# Altium footprint library Connectors THD.PcbLib: 631 footprints (part 35 of 46)
Each footprint in its own frame and in the unit in brackets; x right, y up, seen from the top. Pads: shape width x height; smd on the part's side, far side on the other; paste and mask are expansions set on the pad; w line width, h text height; cw(c..) or ccw(c..) is an arc to the next point about the centre after c.
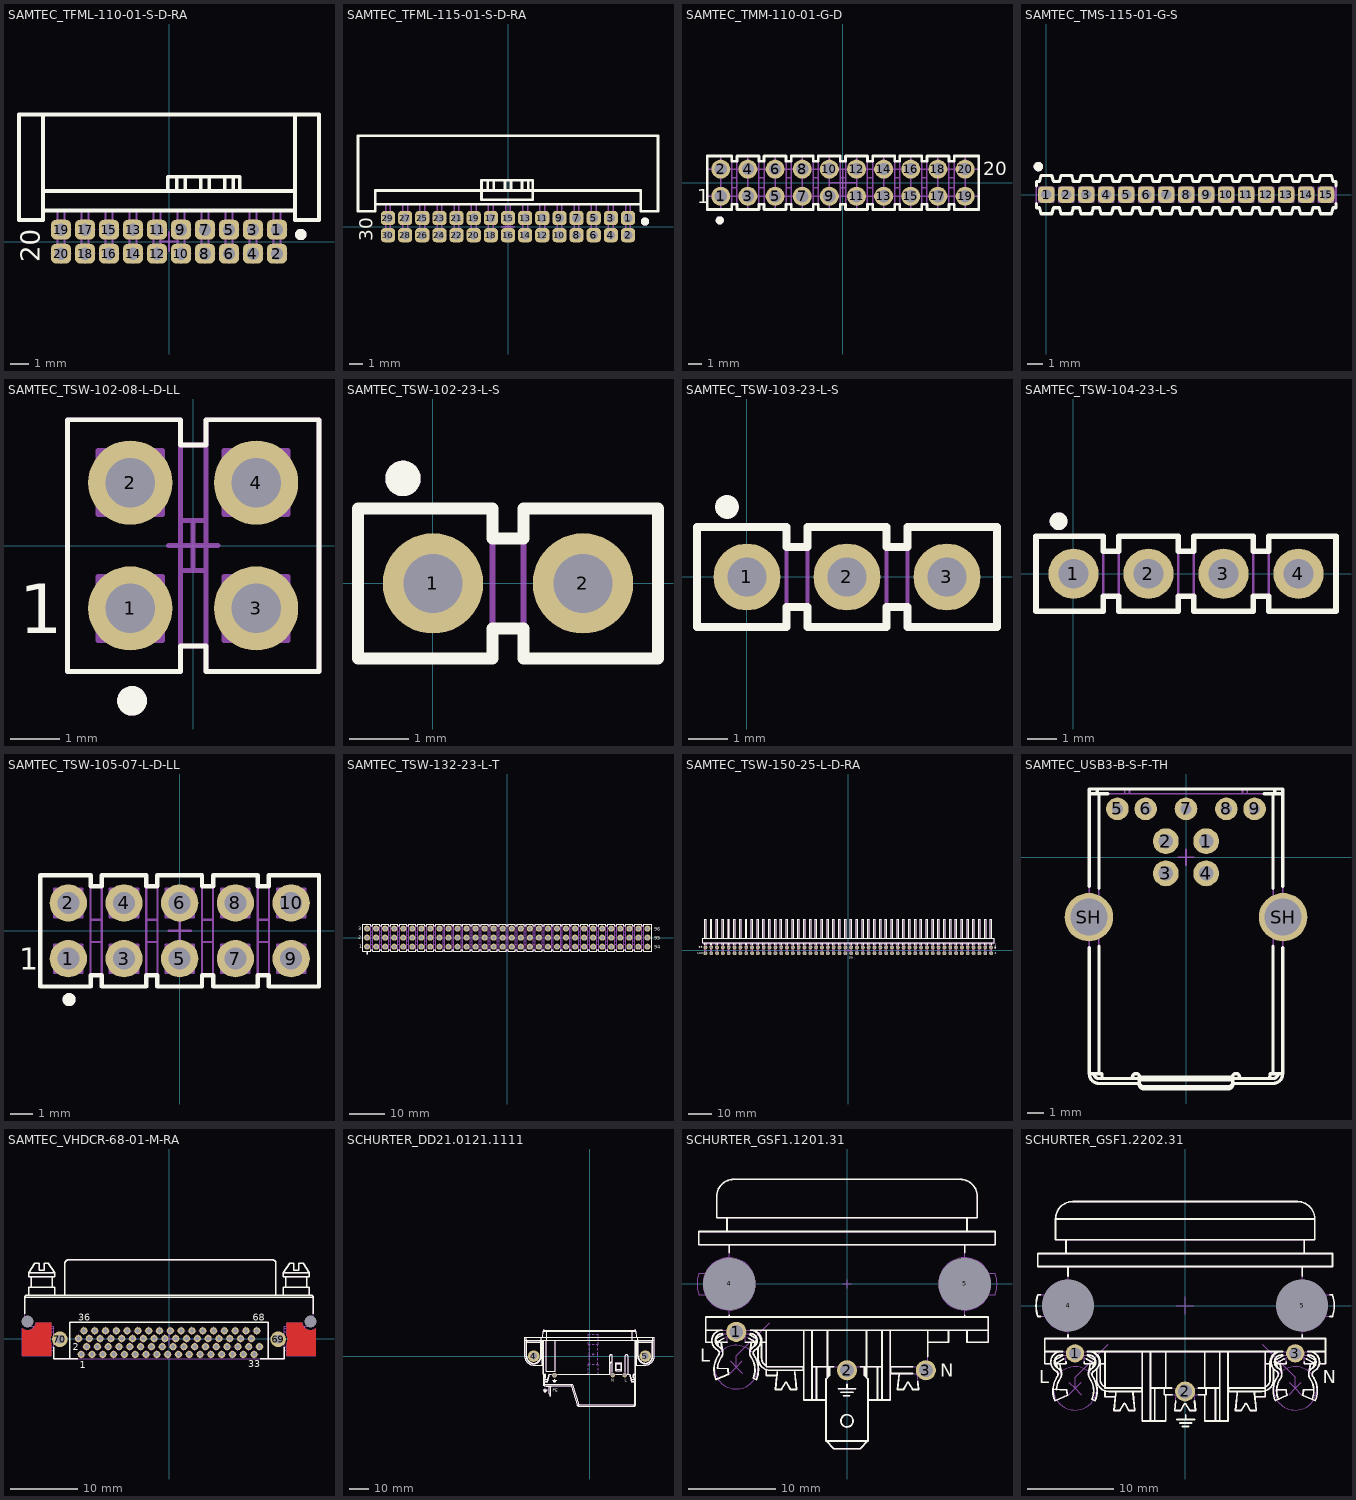
[diagram p34: the footprints below, top view; thin cyan lines are the x and y axes]

## SAMTEC_TFML-110-01-S-D-RA [mm] "20 Contacts - Pitch 1.27mm - Dual Row Right Angle Through-Hole Header"
height 5.72
pads (20):
  rrect50% 1.05x1.05 hole 0.65: 1(5.715,0.635) 2(5.715,-0.635) 3(4.445,0.635) 4(4.445,-0.635) 5(3.175,0.635) 6(3.175,-0.635) 7(1.905,0.635) 8(1.905,-0.635) 9(0.635,0.635) 10(0.635,-0.635) 11(-0.635,0.635) 12(-0.635,-0.635) 13(-1.905,0.635) 14(-1.905,-0.635) 15(-3.175,0.635) 16(-3.175,-0.635) 17(-4.445,0.635) 18(-4.445,-0.635) 19(-5.715,0.635) 20(-5.715,-0.635)
Top Overlay:
  circle w0.3: c6.975,0.375 r0.15
  lines w0.2: -6.668,1.651 6.668,1.651 ; -6.668,2.678 6.668,2.678 ; -6.668,6.731 -6.668,1.143 -7.938,1.143 -7.938,6.731 7.938,6.731 7.938,1.143 6.668,1.143 6.668,6.731 ; -0.064,2.678 -0.064,3.429 3.747,3.429 3.747,2.678 ; 0.406,2.678 0.406,3.429 ; 0.864,2.678 0.864,3.429 ; 1.676,2.678 1.676,3.429 ; 2.134,2.678 2.134,3.429 ; 2.946,2.678 2.946,3.429 ; 3.404,2.678 3.404,3.429
  text "20" at -6.847,-1.097 h1
Mechanical 8:
  lines w0.1: -6.215,-0.635 -5.715,-0.635 ; -6.215,0.635 -5.715,0.635 ; -5.715,-1.135 -5.715,-0.635 ; -5.715,-0.135 -5.715,-0.635 ; -5.715,0.135 -5.715,0.635 ; -5.715,1.135 -5.715,0.635 ; -5.215,-0.635 -5.715,-0.635 ; -5.215,0.635 -5.715,0.635 ; -4.945,-0.635 -4.445,-0.635 ; -4.945,0.635 -4.445,0.635 ; -4.445,-1.135 -4.445,-0.635 ; -4.445,-0.135 -4.445,-0.635 ; -4.445,0.135 -4.445,0.635 ; -4.445,1.135 -4.445,0.635 ; -3.945,-0.635 -4.445,-0.635 ; -3.945,0.635 -4.445,0.635 ; -3.675,-0.635 -3.175,-0.635 ; -3.675,0.635 -3.175,0.635 ; -3.175,-1.135 -3.175,-0.635 ; -3.175,-0.135 -3.175,-0.635 ; -3.175,0.135 -3.175,0.635 ; -3.175,1.135 -3.175,0.635 ; -2.675,-0.635 -3.175,-0.635 ; -2.675,0.635 -3.175,0.635 ; -2.405,-0.635 -1.905,-0.635 ; -2.405,0.635 -1.905,0.635 ; -1.905,-1.135 -1.905,-0.635 ; -1.905,-0.135 -1.905,-0.635 ; -1.905,0.135 -1.905,0.635 ; -1.905,1.135 -1.905,0.635 ; -1.405,-0.635 -1.905,-0.635 ; -1.405,0.635 -1.905,0.635 ; -1.135,-0.635 -0.635,-0.635 ; -1.135,0.635 -0.635,0.635 ; -0.635,-1.135 -0.635,-0.635 ; -0.635,-0.135 -0.635,-0.635 ; -0.635,0.135 -0.635,0.635 ; -0.635,1.135 -0.635,0.635 ; -0.5,0 0,0 ; -0.135,-0.635 -0.635,-0.635 ; -0.135,0.635 -0.635,0.635 ; 0,-0.5 0,0 ; 0,0.5 0,0 ; 0.135,-0.635 0.635,-0.635 ; 0.135,0.635 0.635,0.635 ; 0.5,0 0,0 ; 0.635,-1.135 0.635,-0.635 ; 0.635,-0.135 0.635,-0.635 ; 0.635,0.135 0.635,0.635 ; 0.635,1.135 0.635,0.635 ; 1.135,-0.635 0.635,-0.635 ; 1.135,0.635 0.635,0.635 ; 1.405,-0.635 1.905,-0.635 ; 1.405,0.635 1.905,0.635 ; 1.905,-1.135 1.905,-0.635 ; 1.905,-0.135 1.905,-0.635 ; 1.905,0.135 1.905,0.635 ; 1.905,1.135 1.905,0.635 ; 2.405,-0.635 1.905,-0.635 ; 2.405,0.635 1.905,0.635 ; 2.675,-0.635 3.175,-0.635 ; 2.675,0.635 3.175,0.635 ; 3.175,-1.135 3.175,-0.635 ; 3.175,-0.135 3.175,-0.635 ; 3.175,0.135 3.175,0.635 ; 3.175,1.135 3.175,0.635 ; 3.675,-0.635 3.175,-0.635 ; 3.675,0.635 3.175,0.635 ; 3.945,-0.635 4.445,-0.635 ; 3.945,0.635 4.445,0.635 ; 4.445,-1.135 4.445,-0.635 ; 4.445,-0.135 4.445,-0.635 ; 4.445,0.135 4.445,0.635 ; 4.445,1.135 4.445,0.635 ; 4.945,-0.635 4.445,-0.635 ; 4.945,0.635 4.445,0.635 ; 5.215,-0.635 5.715,-0.635 ; 5.215,0.635 5.715,0.635 ; 5.715,-1.135 5.715,-0.635 ; 5.715,-0.135 5.715,-0.635 ; 5.715,0.135 5.715,0.635 ; 5.715,1.135 5.715,0.635 ; 6.215,-0.635 5.715,-0.635 ; 6.215,0.635 5.715,0.635
Mechanical 14:
  circle w0.3: c6.975,0.375 r0.15
  lines w0.1: -6.668,1.651 6.668,1.651 ; -6.668,2.678 6.668,2.678 ; -6.668,6.731 -6.668,1.143 -7.938,1.143 -7.938,6.731 7.938,6.731 7.938,1.143 6.668,1.143 6.668,6.731 ; -5.893,1.651 -5.893,-0.762 -5.537,-0.762 -5.537,1.651 ; -4.623,1.651 -4.623,-0.762 -4.267,-0.762 -4.267,1.651 ; -3.353,1.651 -3.353,-0.762 -2.997,-0.762 -2.997,1.651 ; -2.083,1.651 -2.083,-0.762 -1.727,-0.762 -1.727,1.651 ; -0.813,1.651 -0.813,-0.762 -0.457,-0.762 -0.457,1.651 ; -0.064,2.678 -0.064,3.429 3.747,3.429 3.747,2.678 ; 0.406,2.678 0.406,3.429 ; 0.457,1.651 0.457,-0.762 0.813,-0.762 0.813,1.651 ; 0.864,2.678 0.864,3.429 ; 1.676,2.678 1.676,3.429 ; 1.727,1.651 1.727,-0.762 2.083,-0.762 2.083,1.651 ; 2.134,2.678 2.134,3.429 ; 2.946,2.678 2.946,3.429 ; 2.997,1.651 2.997,-0.762 3.353,-0.762 3.353,1.651 ; 3.404,2.678 3.404,3.429 ; 4.267,1.651 4.267,-0.762 4.623,-0.762 4.623,1.651 ; 5.537,1.651 5.537,-0.762 5.893,-0.762 5.893,1.651
  text "20" at -6.847,-1.097 h1
3D body: height 5.71, standoff -1.91, extent -7.937,-0.762 7.938,6.731

## SAMTEC_TFML-115-01-S-D-RA [mm] "30 Contacts - Pitch 1.27mm - Dual Row Right Angle Through-Hole Header"
height 5.72
pads (30):
  rrect50% 1.05x1.05 hole 0.65: 1(8.89,0.635) 2(8.89,-0.635) 3(7.62,0.635) 4(7.62,-0.635) 5(6.35,0.635) 6(6.35,-0.635) 7(5.08,0.635) 8(5.08,-0.635) 9(3.81,0.635) 10(3.81,-0.635) 11(2.54,0.635) 12(2.54,-0.635) 13(1.27,0.635) 14(1.27,-0.635) 15(0,0.635) 16(0,-0.635) 17(-1.27,0.635) 18(-1.27,-0.635) 19(-2.54,0.635) 20(-2.54,-0.635) 21(-3.81,0.635) 22(-3.81,-0.635) 23(-5.08,0.635) 24(-5.08,-0.635) 25(-6.35,0.635) 26(-6.35,-0.635) 27(-7.62,0.635) 28(-7.62,-0.635) 29(-8.89,0.635) 30(-8.89,-0.635)
Top Overlay:
  circle w0.3: c10.15,0.375 r0.15
  lines w0.2: -9.843,1.651 9.843,1.651 ; -1.499,2.678 -1.499,3.429 ; -1.046,2.678 -1.046,3.429 ; -0.229,2.678 -0.229,3.429 ; 0.229,2.678 0.229,3.429 ; 1.041,2.678 1.041,3.429 ; 1.499,2.678 1.499,3.429 ; -11.113,1.143 -9.843,1.143 -9.843,2.678 9.843,2.678 9.843,1.143 11.113,1.143 11.113,6.731 -11.113,6.731 -11.113,1.143 ; -1.968,1.981 -1.968,3.429 1.841,3.429 1.841,1.981 -1.968,1.981
  text "30" at -10.022,-1.097 h1
Mechanical 8:
  lines w0.1: -9.39,-0.635 -8.89,-0.635 ; -9.39,0.635 -8.89,0.635 ; -8.89,-1.135 -8.89,-0.635 ; -8.89,-0.135 -8.89,-0.635 ; -8.89,0.135 -8.89,0.635 ; -8.89,1.135 -8.89,0.635 ; -8.39,-0.635 -8.89,-0.635 ; -8.39,0.635 -8.89,0.635 ; -8.12,-0.635 -7.62,-0.635 ; -8.12,0.635 -7.62,0.635 ; -7.62,-1.135 -7.62,-0.635 ; -7.62,-0.135 -7.62,-0.635 ; -7.62,0.135 -7.62,0.635 ; -7.62,1.135 -7.62,0.635 ; -7.12,-0.635 -7.62,-0.635 ; -7.12,0.635 -7.62,0.635 ; -6.85,-0.635 -6.35,-0.635 ; -6.85,0.635 -6.35,0.635 ; -6.35,-1.135 -6.35,-0.635 ; -6.35,-0.135 -6.35,-0.635 ; -6.35,0.135 -6.35,0.635 ; -6.35,1.135 -6.35,0.635 ; -5.85,-0.635 -6.35,-0.635 ; -5.85,0.635 -6.35,0.635 ; -5.58,-0.635 -5.08,-0.635 ; -5.58,0.635 -5.08,0.635 ; -5.08,-1.135 -5.08,-0.635 ; -5.08,-0.135 -5.08,-0.635 ; -5.08,0.135 -5.08,0.635 ; -5.08,1.135 -5.08,0.635 ; -4.58,-0.635 -5.08,-0.635 ; -4.58,0.635 -5.08,0.635 ; -4.31,-0.635 -3.81,-0.635 ; -4.31,0.635 -3.81,0.635 ; -3.81,-1.135 -3.81,-0.635 ; -3.81,-0.135 -3.81,-0.635 ; -3.81,0.135 -3.81,0.635 ; -3.81,1.135 -3.81,0.635 ; -3.31,-0.635 -3.81,-0.635 ; -3.31,0.635 -3.81,0.635 ; -3.04,-0.635 -2.54,-0.635 ; -3.04,0.635 -2.54,0.635 ; -2.54,-1.135 -2.54,-0.635 ; -2.54,-0.135 -2.54,-0.635 ; -2.54,0.135 -2.54,0.635 ; -2.54,1.135 -2.54,0.635 ; -2.04,-0.635 -2.54,-0.635 ; -2.04,0.635 -2.54,0.635 ; -1.77,-0.635 -1.27,-0.635 ; -1.77,0.635 -1.27,0.635 ; -1.27,-1.135 -1.27,-0.635 ; -1.27,-0.135 -1.27,-0.635 ; -1.27,0.135 -1.27,0.635 ; -1.27,1.135 -1.27,0.635 ; -0.77,-0.635 -1.27,-0.635 ; -0.77,0.635 -1.27,0.635 ; -0.5,-0.635 0,-0.635 ; -0.5,0 0,0 ; -0.5,0.635 0,0.635 ; 0,-1.135 0,-0.635 ; 0,-0.5 0,0 ; 0,-0.135 0,-0.635 ; 0,0.135 0,0.635 ; 0,0.5 0,0 ; 0,1.135 0,0.635 ; 0.5,-0.635 0,-0.635 ; 0.5,0 0,0 ; 0.5,0.635 0,0.635 ; 0.77,-0.635 1.27,-0.635 ; 0.77,0.635 1.27,0.635 ; 1.27,-1.135 1.27,-0.635 ; 1.27,-0.135 1.27,-0.635 ; 1.27,0.135 1.27,0.635 ; 1.27,1.135 1.27,0.635 ; 1.77,-0.635 1.27,-0.635 ; 1.77,0.635 1.27,0.635 ; 2.04,-0.635 2.54,-0.635 ; 2.04,0.635 2.54,0.635 ; 2.54,-1.135 2.54,-0.635 ; 2.54,-0.135 2.54,-0.635 ; 2.54,0.135 2.54,0.635 ; 2.54,1.135 2.54,0.635 ; 3.04,-0.635 2.54,-0.635 ; 3.04,0.635 2.54,0.635 ; 3.31,-0.635 3.81,-0.635 ; 3.31,0.635 3.81,0.635 ; 3.81,-1.135 3.81,-0.635 ; 3.81,-0.135 3.81,-0.635 ; 3.81,0.135 3.81,0.635 ; 3.81,1.135 3.81,0.635 ; 4.31,-0.635 3.81,-0.635 ; 4.31,0.635 3.81,0.635 ; 4.58,-0.635 5.08,-0.635 ; 4.58,0.635 5.08,0.635 ; 5.08,-1.135 5.08,-0.635 ; 5.08,-0.135 5.08,-0.635 ; 5.08,0.135 5.08,0.635 ; 5.08,1.135 5.08,0.635 ; 5.58,-0.635 5.08,-0.635 ; 5.58,0.635 5.08,0.635 ; 5.85,-0.635 6.35,-0.635 ; 5.85,0.635 6.35,0.635 ; 6.35,-1.135 6.35,-0.635 ; 6.35,-0.135 6.35,-0.635 ; 6.35,0.135 6.35,0.635 ; 6.35,1.135 6.35,0.635 ; 6.85,-0.635 6.35,-0.635 ; 6.85,0.635 6.35,0.635 ; 7.12,-0.635 7.62,-0.635 ; 7.12,0.635 7.62,0.635 ; 7.62,-1.135 7.62,-0.635 ; 7.62,-0.135 7.62,-0.635 ; 7.62,0.135 7.62,0.635 ; 7.62,1.135 7.62,0.635 ; 8.12,-0.635 7.62,-0.635 ; 8.12,0.635 7.62,0.635 ; 8.39,-0.635 8.89,-0.635 ; 8.39,0.635 8.89,0.635 ; 8.89,-1.135 8.89,-0.635 ; 8.89,-0.135 8.89,-0.635 ; 8.89,0.135 8.89,0.635 ; 8.89,1.135 8.89,0.635 ; 9.39,-0.635 8.89,-0.635 ; 9.39,0.635 8.89,0.635
Mechanical 14:
  circle w0.3: c10.15,0.375 r0.15
  lines w0.1: -9.843,1.651 9.843,1.651 ; -9.068,1.651 -9.068,-0.762 -8.712,-0.762 -8.712,1.651 ; -7.798,1.651 -7.798,-0.762 -7.442,-0.762 -7.442,1.651 ; -6.528,1.651 -6.528,-0.762 -6.172,-0.762 -6.172,1.651 ; -5.258,1.651 -5.258,-0.762 -4.902,-0.762 -4.902,1.651 ; -3.988,1.651 -3.988,-0.762 -3.632,-0.762 -3.632,1.651 ; -2.718,1.651 -2.718,-0.762 -2.362,-0.762 -2.362,1.651 ; -1.499,2.678 -1.499,3.429 ; -1.448,1.651 -1.448,-0.762 -1.092,-0.762 -1.092,1.651 ; -1.046,2.678 -1.046,3.429 ; -0.229,2.678 -0.229,3.429 ; -0.178,1.651 -0.178,-0.762 0.178,-0.762 0.178,1.651 ; 0.229,2.678 0.229,3.429 ; 1.041,2.678 1.041,3.429 ; 1.092,1.651 1.092,-0.762 1.448,-0.762 1.448,1.651 ; 1.499,2.678 1.499,3.429 ; 2.362,1.651 2.362,-0.762 2.718,-0.762 2.718,1.651 ; 3.632,1.651 3.632,-0.762 3.988,-0.762 3.988,1.651 ; 4.902,1.651 4.902,-0.762 5.258,-0.762 5.258,1.651 ; 6.172,1.651 6.172,-0.762 6.528,-0.762 6.528,1.651 ; 7.442,1.651 7.442,-0.762 7.798,-0.762 7.798,1.651 ; 8.712,1.651 8.712,-0.762 9.068,-0.762 9.068,1.651 ; -11.113,1.143 -9.843,1.143 -9.843,2.678 9.843,2.678 9.843,1.143 11.113,1.143 11.113,6.731 -11.113,6.731 -11.113,1.143 ; -1.968,1.981 -1.968,3.429 1.841,3.429 1.841,1.981 -1.968,1.981
  text "30" at -10.022,-1.097 h1
3D body: height 5.71, standoff -1.91, extent -11.112,-0.762 11.113,6.731

## SAMTEC_TMM-110-01-G-D [mm] "20 Contacts - Pitch 2mm - Dual Row Straight Strip Header - Insulator 1.5mm"
height 4.7
pads (20):
  round 1.4 hole 0.9: 1(-9,-1) 2(-9,1) 3(-7,-1) 4(-7,1) 5(-5,-1) 6(-5,1) 7(-3,-1) 8(-3,1) 9(-1,-1) 10(-1,1) 11(1,-1) 12(1,1) 13(3,-1) 14(3,1) 15(5,-1) 16(5,1) 17(7,-1) 18(7,1) 19(9,-1) 20(9,1)
Top Overlay:
  circle w0.3: c-9.073,-2.778 r0.15
  lines w0.2: -10,-1.968 -8.19,-1.968 -8.19,-1.587 -7.809,-1.587 -7.809,-1.968 -6.19,-1.968 -6.19,-1.587 -5.809,-1.587 -5.809,-1.968 -4.19,-1.968 -4.19,-1.587 -3.809,-1.587 -3.809,-1.968 -2.19,-1.968 -2.19,-1.587 -1.809,-1.587 -1.809,-1.968 -0.19,-1.968 -0.19,-1.587 0.191,-1.587 0.191,-1.968 1.81,-1.968 1.81,-1.587 2.191,-1.587 2.191,-1.968 3.81,-1.968 3.81,-1.587 4.191,-1.587 4.191,-1.968 5.81,-1.968 5.81,-1.587 6.191,-1.587 6.191,-1.968 7.81,-1.968 7.81,-1.587 8.191,-1.587 8.191,-1.968 10.004,-1.968 10.004,1.968 8.191,1.968 8.191,1.587 7.81,1.587 7.81,1.968 6.191,1.968 6.191,1.587 5.81,1.587 5.81,1.968 4.191,1.968 4.191,1.587 3.81,1.587 3.81,1.968 2.191,1.968 2.191,1.587 1.81,1.587 1.81,1.968 0.191,1.968 0.191,1.587 -0.19,1.587 -0.19,1.968 -1.809,1.968 -1.809,1.587 -2.19,1.587 -2.19,1.968 -3.809,1.968 -3.809,1.587 -4.19,1.587 -4.19,1.968 -5.809,1.968 -5.809,1.587 -6.19,1.587 -6.19,1.968 -7.809,1.968 -7.809,1.587 -8.19,1.587 -8.19,1.968 -10,1.968 -10,-1.968
  text "20" at 10.35,0.55 h1
  text "1" at -10.75,-1.525 h1.02
Mechanical 8:
  lines w0.1: -10,-1 -9,-1 ; -10,1 -9,1 ; -9,-2 -9,-1 ; -9,2 -9,1 ; -7,-2 -7,-1 ; -7,2 -7,1 ; -5,-2 -5,-1 ; -5,2 -5,1 ; -3,-2 -3,-1 ; -3,2 -3,1 ; -1,-2 -1,-1 ; -1,2 -1,1 ; 1,-2 1,-1 ; 1,2 1,1 ; 3,-2 3,-1 ; 3,2 3,1 ; 5,-2 5,-1 ; 5,2 5,1 ; 7,-2 7,-1 ; 7,2 7,1 ; 9,-2 9,-1 ; 9,2 9,1 ; 10,-1 9,-1 ; 10,1 9,1 ; -9,-1 -8,-1 -7,-1 ; -9,-1 -9,0 -9,1 ; -9,1 -8,1 -7,1 ; -7,-1 -6,-1 -5,-1 ; -7,-1 -7,0 -7,1 ; -7,1 -6,1 -5,1 ; -5,-1 -4,-1 -3,-1 ; -5,-1 -5,0 -5,1 ; -5,1 -4,1 -3,1 ; -3,-1 -2,-1 -1,-1 ; -3,-1 -3,0 -3,1 ; -3,1 -2,1 -1,1 ; -1,-1 0,-1 ; -1,-1 -1,0 ; -1,0 -1,1 ; -1,0 0,0 ; -1,1 0,1 ; 0,-1 0,0 ; 0,-1 1,-1 ; 0,0 1,0 ; 0,0 0,1 ; 0,1 1,1 ; 1,-1 2,-1 3,-1 ; 1,-1 1,0 ; 1,0 1,1 ; 1,1 2,1 3,1 ; 3,-1 4,-1 5,-1 ; 3,-1 3,0 3,1 ; 3,1 4,1 5,1 ; 5,-1 6,-1 7,-1 ; 5,-1 5,0 5,1 ; 5,1 6,1 7,1 ; 7,-1 8,-1 9,-1 ; 7,-1 7,0 7,1 ; 7,1 8,1 9,1 ; 9,-1 9,0 9,1
Mechanical 14:
  drawing of 157 lines, arcs and shapes, not listed
  text "20" at 10.35,0.55 h1
  text "1" at -10.75,-1.525 h1.02
3D body: height 4.7, standoff -3.5, extent -10,-1.968 10,1.969

## SAMTEC_TMS-115-01-G-S [mm] "1.27mm Pitch SIL Vertical PC Tail Header"
height 8.13
pads (15):
  rrect50% 1.05x1.05 hole 0.65: 1(0,0) 2(1.27,0) 3(2.54,0) 4(3.81,0) 5(5.08,0) 6(6.35,0) 7(7.62,0) 8(8.89,0) 9(10.16,0) 10(11.43,0) 11(12.7,0) 12(13.97,0) 13(15.24,0) 14(16.51,0) 15(17.78,0)
Top Overlay:
  circle w0.3: c-0.508,1.778 r0.15
  lines w0.2: -0.635,-0.561 -0.635,-0.838 -0.445,-0.838 -0.342,-1.219 0.342,-1.219 0.445,-0.838 0.826,-0.838 0.928,-1.219 1.612,-1.219 1.714,-0.838 2.095,-0.838 2.198,-1.219 2.882,-1.219 2.985,-0.838 3.366,-0.838 3.468,-1.219 4.152,-1.219 4.255,-0.838 4.636,-0.838 4.738,-1.219 5.422,-1.219 5.525,-0.838 5.906,-0.838 6.008,-1.219 6.692,-1.219 6.795,-0.838 7.176,-0.838 7.278,-1.219 7.962,-1.219 8.065,-0.838 8.446,-0.838 8.548,-1.219 9.232,-1.219 9.335,-0.838 9.716,-0.838 9.818,-1.219 10.502,-1.219 10.605,-0.838 10.986,-0.838 11.088,-1.219 11.772,-1.219 11.875,-0.838 12.256,-0.838 12.358,-1.219 13.042,-1.219 13.145,-0.838 13.526,-0.838 13.628,-1.219 14.312,-1.219 14.415,-0.838 14.796,-0.838 14.898,-1.219 15.582,-1.219 15.685,-0.838 16.066,-0.838 16.168,-1.219 16.852,-1.219 16.955,-0.838 17.336,-0.838 17.438,-1.219 18.122,-1.219 18.225,-0.838 18.415,-0.838 18.415,-0.561 ; -0.635,0.561 -0.635,0.838 -0.445,0.838 -0.342,1.219 0.342,1.219 0.445,0.838 0.826,0.838 0.928,1.219 1.612,1.219 1.714,0.838 2.095,0.838 2.198,1.219 2.882,1.219 2.985,0.838 3.366,0.838 3.468,1.219 4.152,1.219 4.255,0.838 4.636,0.838 4.738,1.219 5.422,1.219 5.525,0.838 5.906,0.838 6.008,1.219 6.692,1.219 6.795,0.838 7.176,0.838 7.278,1.219 7.962,1.219 8.065,0.838 8.446,0.838 8.548,1.219 9.232,1.219 9.335,0.838 9.716,0.838 9.818,1.219 10.502,1.219 10.605,0.838 10.986,0.838 11.088,1.219 11.772,1.219 11.875,0.838 12.256,0.838 12.358,1.219 13.042,1.219 13.145,0.838 13.526,0.838 13.628,1.219 14.312,1.219 14.415,0.838 14.796,0.838 14.898,1.219 15.582,1.219 15.685,0.838 16.066,0.838 16.168,1.219 16.852,1.219 16.955,0.838 17.336,0.838 17.438,1.219 18.122,1.219 18.225,0.838 18.415,0.838 18.415,0.561
Mechanical 8:
  lines w0.1: -0.5,0 0,0 ; 0,-0.5 0,0 ; 0,0.5 0,0 ; 0.5,0 0,0 ; 0.77,0 1.27,0 ; 1.27,-0.5 1.27,0 ; 1.27,0.5 1.27,0 ; 1.77,0 1.27,0 ; 2.04,0 2.54,0 ; 2.54,-0.5 2.54,0 ; 2.54,0.5 2.54,0 ; 3.04,0 2.54,0 ; 3.31,0 3.81,0 ; 3.81,-0.5 3.81,0 ; 3.81,0.5 3.81,0 ; 4.31,0 3.81,0 ; 4.58,0 5.08,0 ; 5.08,-0.5 5.08,0 ; 5.08,0.5 5.08,0 ; 5.58,0 5.08,0 ; 5.85,0 6.35,0 ; 6.35,-0.5 6.35,0 ; 6.35,0.5 6.35,0 ; 6.85,0 6.35,0 ; 7.12,0 7.62,0 ; 7.62,-0.5 7.62,0 ; 7.62,0.5 7.62,0 ; 8.12,0 7.62,0 ; 8.39,0 8.89,0 ; 8.89,-0.5 8.89,0 ; 8.89,0.5 8.89,0 ; 9.39,0 8.89,0 ; 9.66,0 10.16,0 ; 10.16,-0.5 10.16,0 ; 10.16,0.5 10.16,0 ; 10.66,0 10.16,0 ; 10.93,0 11.43,0 ; 11.43,-0.5 11.43,0 ; 11.43,0.5 11.43,0 ; 11.93,0 11.43,0 ; 12.2,0 12.7,0 ; 12.7,-0.5 12.7,0 ; 12.7,0.5 12.7,0 ; 13.2,0 12.7,0 ; 13.47,0 13.97,0 ; 13.97,-0.5 13.97,0 ; 13.97,0.5 13.97,0 ; 14.47,0 13.97,0 ; 14.74,0 15.24,0 ; 15.24,-0.5 15.24,0 ; 15.24,0.5 15.24,0 ; 15.74,0 15.24,0 ; 16.01,0 16.51,0 ; 16.51,-0.5 16.51,0 ; 16.51,0.5 16.51,0 ; 17.01,0 16.51,0 ; 17.28,0 17.78,0 ; 17.78,-0.5 17.78,0 ; 17.78,0.5 17.78,0 ; 18.28,0 17.78,0
Mechanical 14:
  drawing of 425 lines, arcs and shapes, not listed
3D body: height 5.08, standoff -3.05, extent -0.635,-1.219 18.415,1.219

## SAMTEC_TSW-102-08-L-D-LL [mm] "4 Contacts, Pitch 2.54mm - Dual Row, Through Mount Straigh Header"
height 8.38
pads (4):
  round 1.7 hole 1: 1(-1.27,-1.27) 2(-1.27,1.27) 3(1.27,-1.27) 4(1.27,1.27)
Top Overlay:
  circle w0.3: c-1.235,-3.135 r0.15
  lines w0.1: 2.54,-2.54 2.54,2.54 ; 2.54,-2.54 0.254,-2.54 0.254,-2.032 -0.254,-2.032 -0.254,-2.54 -2.54,-2.54 -2.54,2.54 -0.254,2.54 -0.254,2.032 0.254,2.032 0.254,2.54 2.54,2.54 ; 2.54,-2.54 2.54,2.54
  text "1" at -3.517,-1.768 h1
Mechanical 8:
  lines w0.1: -1.77,-1.27 -1.27,-1.27 ; -1.77,1.27 -1.27,1.27 ; -1.27,-1.77 -1.27,-1.27 ; -1.27,-0.77 -1.27,-1.27 ; -1.27,0.77 -1.27,1.27 ; -1.27,1.77 -1.27,1.27 ; -0.77,-1.27 -1.27,-1.27 ; -0.77,1.27 -1.27,1.27 ; -0.5,0 0,0 ; 0,-0.5 0,0 ; 0,0.5 0,0 ; 0.5,0 0,0 ; 0.77,-1.27 1.27,-1.27 ; 0.77,1.27 1.27,1.27 ; 1.27,-1.77 1.27,-1.27 ; 1.27,-0.77 1.27,-1.27 ; 1.27,0.77 1.27,1.27 ; 1.27,1.77 1.27,1.27 ; 1.77,-1.27 1.27,-1.27 ; 1.77,1.27 1.27,1.27
Mechanical 14:
  circle w0.3: c-1.235,-3.135 r0.15
  lines w0.1: -0.254,-2.032 0.254,-2.032 ; -0.254,-0.508 0.254,-0.508 ; -0.254,0.508 0.254,0.508 ; -0.254,2.032 0.254,2.032 ; -2.54,-2.54 -2.54,2.54 ; -2.54,-2.54 -2.54,2.54 ; -2.54,-2.54 -0.254,-2.54 ; -2.54,2.54 -0.254,2.54 ; -1.918,-1.918 -1.587,-1.587 ; -1.918,-1.918 -1.918,-0.622 ; -1.918,-1.918 -0.622,-1.918 ; -1.918,-0.622 -1.587,-0.953 ; -1.918,-0.622 -0.622,-0.622 ; -1.918,0.622 -1.587,0.953 ; -1.918,0.622 -1.918,1.918 ; -1.918,0.622 -0.622,0.622 ; -1.918,1.918 -1.587,1.587 ; -1.918,1.918 -0.622,1.918 ; -1.587,-1.587 -1.587,-0.953 ; -1.587,-1.587 -0.953,-1.587 ; -1.587,-0.953 -0.953,-0.953 ; -1.587,0.953 -1.587,1.587 ; -1.587,0.953 -0.953,0.953 ; -1.587,1.587 -0.953,1.587 ; -0.953,-1.587 -0.622,-1.918 ; -0.953,-1.587 -0.953,-0.953 ; -0.953,-0.953 -0.622,-0.622 ; -0.953,0.953 -0.622,0.622 ; -0.953,0.953 -0.953,1.587 ; -0.953,1.587 -0.622,1.918 ; -0.622,-1.918 -0.622,-0.622 ; -0.622,0.622 -0.622,1.918 ; -0.254,-2.54 -0.254,2.54 ; -0.254,-2.54 -0.254,2.54 ; -0.254,-2.54 -0.254,2.54 ; 0.622,-1.918 0.953,-1.587 ; 0.622,-1.918 0.622,-0.622 ; 0.622,-1.918 1.918,-1.918 ; 0.622,-0.622 0.953,-0.953 ; 0.622,-0.622 1.918,-0.622 ; 0.622,0.622 0.953,0.953 ; 0.622,0.622 0.622,1.918 ; 0.622,0.622 1.918,0.622 ; 0.622,1.918 0.953,1.587 ; 0.622,1.918 1.918,1.918 ; 0.953,-1.587 0.953,-0.953 ; 0.953,-1.587 1.587,-1.587 ; 0.953,-0.953 1.587,-0.953 ; 0.953,0.953 0.953,1.587 ; 0.953,0.953 1.587,0.953 ; 0.953,1.587 1.587,1.587 ; 1.587,-1.587 1.918,-1.918 ; 1.587,-1.587 1.587,-0.953 ; 1.587,-0.953 1.918,-0.622 ; 1.587,0.953 1.918,0.622 ; 1.587,0.953 1.587,1.587 ; 1.587,1.587 1.918,1.918 ; 1.918,-1.918 1.918,-0.622 ; 1.918,0.622 1.918,1.918 ; 2.54,-2.54 2.54,2.54 ; 2.54,-2.54 0.254,-2.54 0.254,2.54 2.54,2.54 ; 2.54,-2.54 2.54,2.54
  text "1" at -3.517,-1.768 h1
3D body: height 8.38, standoff -5.08, extent -2.54,-2.54 2.54,2.54

## SAMTEC_TSW-102-23-L-S [mm] "2 Contacts - Pitch 2.54mm - Single Row  Through Mount Straigh Header (Post Lead 5.84mm, Tail Lead 2.92mm, Insulator 2.54mm)"
height 8.38
pads (2):
  round 1.7 hole 1: 1(0,0) 2(2.54,0)
Top Overlay:
  circle w0.3: c-0.508,1.778 r0.15
  lines w0.2: -1.27,-1.27 -1.27,1.27 1.007,1.27 1.007,0.762 1.533,0.762 1.533,1.27 3.81,1.27 3.81,-1.27 1.533,-1.27 1.533,-0.762 1.007,-0.762 1.007,-1.27 -1.27,-1.27
Mechanical 8:
  lines w0.1: -0.5,0 0,0 ; 0,-0.5 0,0 ; 0,0.5 0,0 ; 0.5,0 0,0 ; 2.04,0 2.54,0 ; 2.54,-0.5 2.54,0 ; 2.54,0.5 2.54,0 ; 3.04,0 2.54,0
Mechanical 14:
  circle w0.3: c-0.508,1.778 r0.15
  lines w0.1: 1.007,-0.762 1.533,-0.762 ; 1.007,0.762 1.533,0.762 ; -1.27,-1.27 -1.27,1.27 1.007,1.27 1.007,-1.27 -1.27,-1.27 ; -0.317,-0.318 -0.317,0.317 0.317,0.317 0.318,-0.317 -0.317,-0.318 ; 1.533,-1.27 1.533,1.27 3.81,1.27 3.81,-1.27 1.533,-1.27 ; 2.223,-0.318 2.223,0.317 2.858,0.317 2.858,-0.318 2.223,-0.318
3D body: height 8.38, standoff -2.92, extent -1.27,-1.27 3.81,1.27

## SAMTEC_TSW-103-23-L-S [mm] "3 Contacts - Pitch 2.54mm - Single Row  Through Mount Straigh Header (Post Lead 5.84mm, Tail Lead 2.92mm, Insulator 2.54mm)"
height 8.38
pads (3):
  round 1.7 hole 1: 1(0,0) 2(2.54,0) 3(5.08,0)
Top Overlay:
  circle w0.3: c-0.508,1.778 r0.15
  lines w0.2: -1.27,-1.27 1.007,-1.27 1.007,-0.762 1.533,-0.762 1.533,-1.27 3.547,-1.27 3.547,-0.762 4.073,-0.762 4.073,-1.27 6.35,-1.27 6.35,1.27 4.073,1.27 4.073,0.762 3.547,0.762 3.547,1.27 1.533,1.27 1.533,0.762 1.007,0.762 1.007,1.27 -1.27,1.27 -1.27,-1.27
Mechanical 8:
  lines w0.1: -0.5,0 0,0 ; 0,-0.5 0,0 ; 0,0.5 0,0 ; 0.5,0 0,0 ; 2.04,0 2.54,0 ; 2.54,-0.5 2.54,0 ; 2.54,0.5 2.54,0 ; 3.04,0 2.54,0 ; 4.58,0 5.08,0 ; 5.08,-0.5 5.08,0 ; 5.08,0.5 5.08,0 ; 5.58,0 5.08,0
Mechanical 14:
  circle w0.3: c-0.508,1.778 r0.15
  lines w0.1: 1.007,-0.762 1.533,-0.762 ; 1.007,0.762 1.533,0.762 ; 3.547,-0.762 4.073,-0.762 ; 3.547,0.762 4.073,0.762 ; -1.27,-1.27 1.007,-1.27 1.007,1.27 -1.27,1.27 -1.27,-1.27 ; -0.317,-0.318 0.318,-0.318 0.317,0.317 -0.317,0.317 -0.317,-0.318 ; 1.533,-1.27 1.533,1.27 3.547,1.27 3.547,-1.27 1.533,-1.27 ; 2.223,-0.318 2.858,-0.318 2.857,0.317 2.223,0.317 2.223,-0.318 ; 4.073,-1.27 6.35,-1.27 6.35,1.27 4.073,1.27 4.073,-1.27 ; 4.763,-0.318 5.398,-0.318 5.398,0.317 4.763,0.317 4.763,-0.318
3D body: height 8.38, standoff -2.92, extent -1.27,-1.27 6.35,1.27
